# Altium footprint library sun_library.PcbLib: 412 footprints (part 1 of 26)
Each footprint in its own frame and in the unit in brackets; x right, y up, seen from the top. Pads: shape width x height; smd on the part's side, far side on the other; paste and mask are expansions set on the pad; w line width, h text height; cw(c..) or ccw(c..) is an arc to the next point about the centre after c.
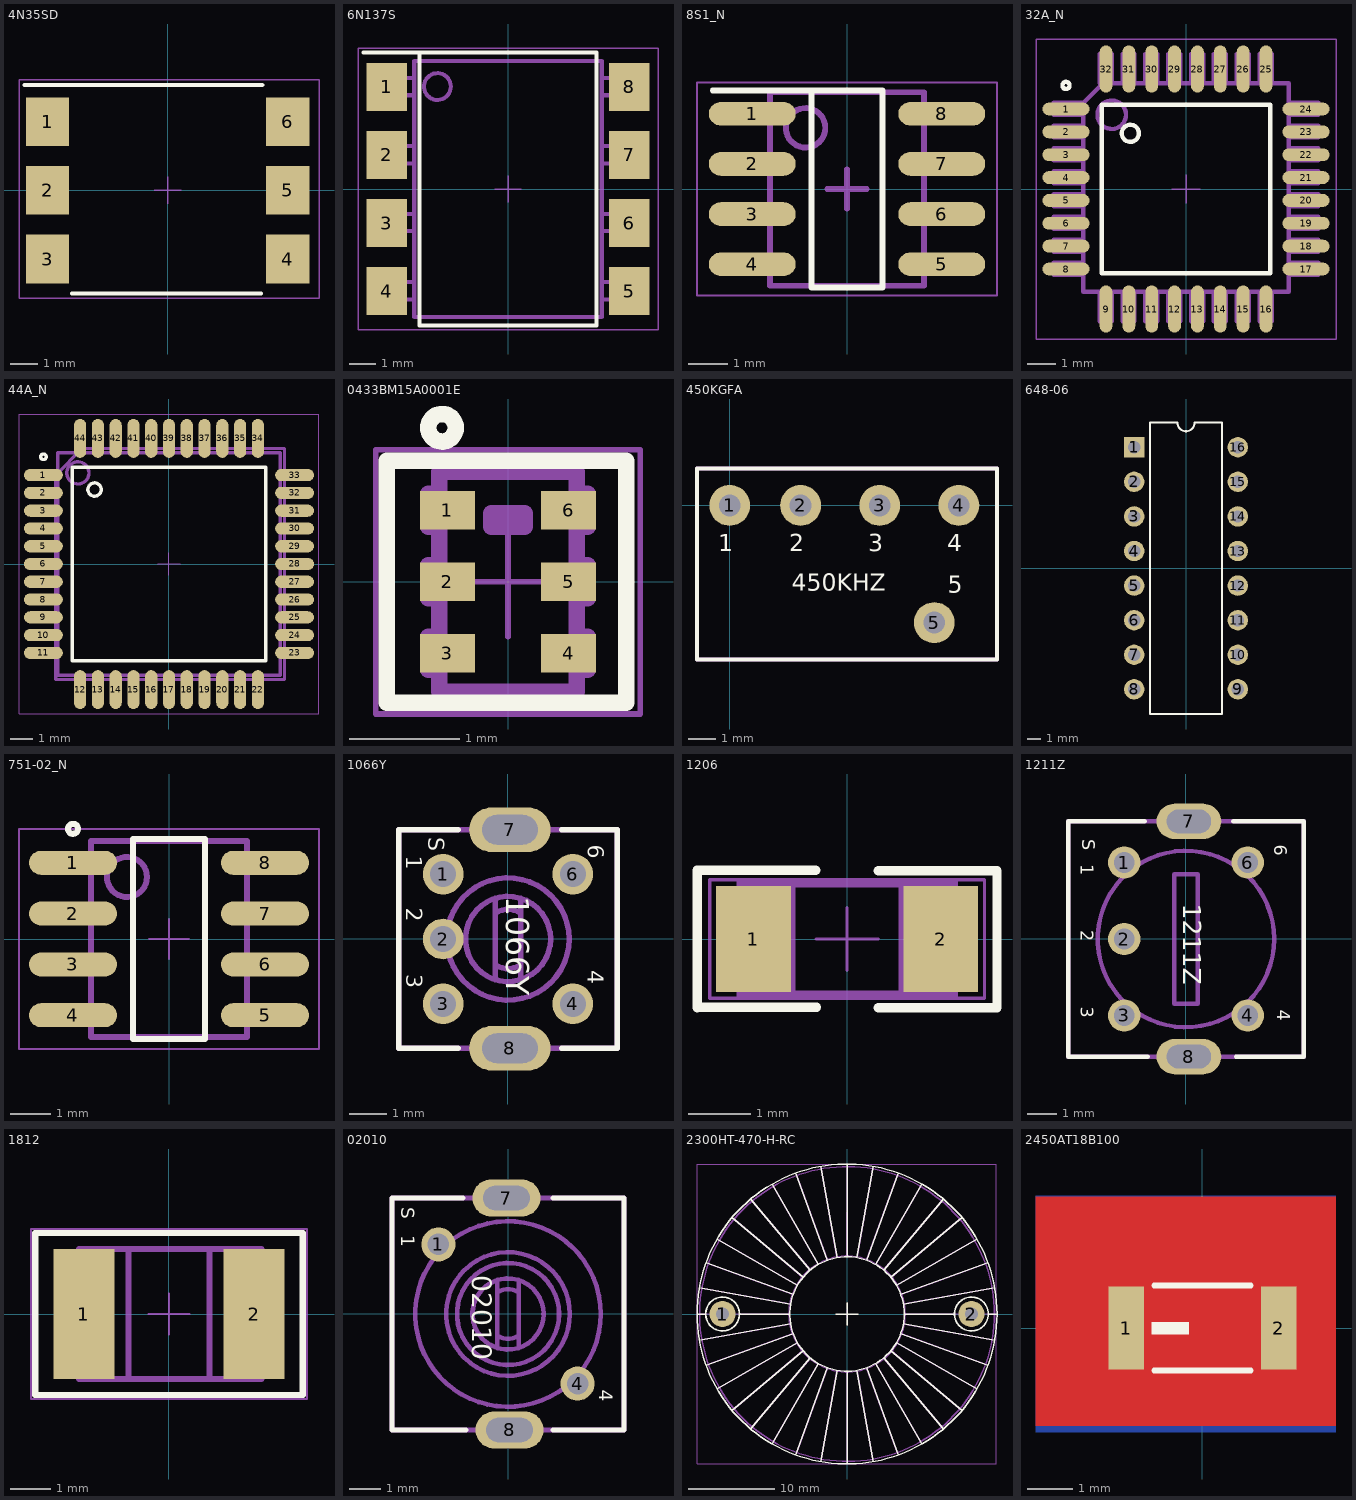
[diagram p0: the footprints below, top view; thin cyan lines are the x and y axes]

## 4N35SD [mm] "оптрон"
height 5
pads (6):
  rect 1.6x1.8 smd: 1(-4.445,2.54) 2(-4.445,0) 3(-4.445,-2.54) 4(4.445,-2.54) 5(4.445,0) 6(4.445,2.54)
Top Overlay:
  lines w0.15: -5.3,3.9 3.5,3.9 ; -3.545,-3.81 3.455,-3.81
CourtTop 15:
  lines w0.05: -0.5,0 0.5,0 ; 0,-0.5 0,0.5 ; -5.5,-4 -5.5,4.1 5.6,4.1 5.6,-4 -5.5,-4

## 6N137S [mm] "Оптрон 10Mbs"
height 1.8
pads (8):
  rect 1.52x1.78 smd: 1(-4.525,3.81) 2(-4.525,1.27) 3(-4.525,-1.27) 4(-4.525,-3.81) 5(4.525,-3.81) 6(4.525,-1.27) 7(4.525,1.27) 8(4.525,3.81)
Top Overlay:
  lines w0.15: -5.4,5.1 -3.3,5.1 ; -3.3,5.1 3.3,5.1 3.3,-5.1 -3.3,-5.1 -3.3,5.1
TopAssy 13:
  circle w0.15: c-2.635,3.825 r0.5
  lines w0.15: -3.5,-4.125 -5.15,-4.125 -5.15,-3.475 -3.5,-3.475 ; -3.5,-1.575 -5.15,-1.575 -5.15,-0.925 -3.5,-0.925 ; -3.5,0.95 -5.15,0.95 -5.15,1.6 -3.5,1.6 ; -3.5,3.5 -5.15,3.5 -5.15,4.15 -3.5,4.15 ; 3.5,-4.125 5.15,-4.125 5.15,-3.475 3.5,-3.475 ; 3.5,-1.575 5.15,-1.575 5.15,-0.925 3.5,-0.925 ; 3.5,0.95 5.15,0.95 5.15,1.6 3.5,1.6 ; 3.5,3.5 5.15,3.5 5.15,4.15 3.5,4.15 ; -3.5,-4.775 -3.5,4.775 3.5,4.775 3.5,-4.775 -3.5,-4.775
CourtTop 15:
  lines w0.05: -0.5,0 0.5,0 ; 0,-0.5 0,0.5 ; -5.6,-5.25 -5.6,5.25 5.6,5.25 5.6,-5.25 -5.6,-5.25
3D body "User Library-pdip8-smd.step": height 5.08, standoff 0, extent -5.15,-4.955 5.15,4.955

## 8S1_N [mm] "8-Pin Small Outline Integrated Circuit 1.27 mm Pitch, IPC Medium Density"
height 1.73
pads (8):
  oval 2.2x0.6 smd: 1(-2.4,1.905) 2(-2.4,0.635) 3(-2.4,-0.635) 4(-2.4,-1.905) 5(2.4,-1.905) 6(2.4,-0.635) 7(2.4,0.635) 8(2.4,1.905)
Top Overlay:
  lines w0.15: -3.4,2.5 -3.4,2.5 ; -3.4,2.5 -0.9,2.5 ; -0.9,2.5 0.9,2.5 0.9,-2.5 -0.9,-2.5 -0.9,2.5
TopAssy 13:
  circle w0.15: c-1.05,1.55 r0.5
  lines w0.15: -0.5,0 0.5,0 ; 0,-0.5 0,0.5 ; -1.95,-2.45 -1.95,2.45 1.95,2.45 1.95,-2.45 -1.95,-2.45
CourtTop 15:
  lines w0.05: -0.5,0 0.5,0 ; 0,-0.5 0,0.5 ; -3.8,-2.7 -3.8,2.7 3.8,2.7 3.8,-2.7 -3.8,-2.7
3D body "User Library-SOIC-8.STEP": height 1.75, standoff 0, extent -3.006,-2.5 3.006,2.5

## 32A_N [mm] "Thin QFP, 32-Leads, Body 7x7mm, Pitch 0.8mm, IPC Medium Density"
height 1.2
pads (32):
  oval 1.65x0.45 smd mask+0.075: 1(-4.2,2.8) 2(-4.2,2) 3(-4.2,1.2) 4(-4.2,0.4) 5(-4.2,-0.4) 6(-4.2,-1.2) 7(-4.2,-2) 8(-4.2,-2.8) 17(4.2,-2.8) 18(4.2,-2) 19(4.2,-1.2) 20(4.2,-0.4) 21(4.2,0.4) 22(4.2,1.2) 23(4.2,2) 24(4.2,2.8)
  oval 0.45x1.65 smd mask+0.075: 9(-2.8,-4.2) 10(-2,-4.2) 11(-1.2,-4.2) 12(-0.4,-4.2) 13(0.4,-4.2) 14(1.2,-4.2) 15(2,-4.2) 16(2.8,-4.2) 25(2.8,4.2) 26(2,4.2) 27(1.2,4.2) 28(0.4,4.2) 29(-0.4,4.2) 30(-1.2,4.2) 31(-2,4.2) 32(-2.8,4.2)
Top Overlay:
  circle w0.15: c-1.95,1.95 r0.3
  circle w0.15: c-4.2,3.625 r0.125
  lines w0.15: -2.95,-2.95 2.95,-2.95 2.95,2.95 -2.95,2.95 -2.95,-2.95
TopAssy 13:
  circle w0.15: c-2.6,2.6 r0.5
  lines w0.15: -3.6,-3 -4.625,-3 -4.625,-2.575 -3.6,-2.575 ; -3.6,-2.2 -4.625,-2.2 -4.625,-1.775 -3.6,-1.775 ; -3.6,-1.4 -4.625,-1.4 -4.625,-0.975 -3.6,-0.975 ; -3.6,-0.6 -4.625,-0.6 -4.625,-0.175 -3.6,-0.175 ; -3.6,0.2 -4.625,0.2 -4.625,0.625 -3.6,0.625 ; -3.6,1 -4.625,1 -4.625,1.425 -3.6,1.425 ; -3.6,1.8 -4.625,1.8 -4.625,2.225 -3.6,2.225 ; -3.025,3.7 -3.025,4.725 -2.6,4.725 -2.6,3.7 ; -2.225,-3.6 -2.225,-4.625 -1.8,-4.625 -1.8,-3.6 ; -2.225,3.7 -2.225,4.725 -1.8,4.725 -1.8,3.7 ; -1.425,-3.6 -1.425,-4.625 -1,-4.625 -1,-3.6 ; -1.425,3.7 -1.425,4.725 -1,4.725 -1,3.7 ; -0.625,-3.6 -0.625,-4.625 -0.2,-4.625 -0.2,-3.6 ; -0.625,3.7 -0.625,4.725 -0.2,4.725 -0.2,3.7 ; 0.175,-3.6 0.175,-4.625 0.6,-4.625 0.6,-3.6 ; 0.175,3.7 0.175,4.725 0.6,4.725 0.6,3.7 ; 0.975,-3.6 0.975,-4.625 1.4,-4.625 1.4,-3.6 ; 0.975,3.7 0.975,4.725 1.4,4.725 1.4,3.7 ; 1.775,-3.6 1.775,-4.625 2.2,-4.625 2.2,-3.6 ; 1.775,3.7 1.775,4.725 2.2,4.725 2.2,3.7 ; 2.575,-3.6 2.575,-4.625 3,-4.625 3,-3.6 ; 3.6,-2.2 4.625,-2.2 4.625,-1.775 3.6,-1.775 ; 3.6,-1.4 4.625,-1.4 4.625,-0.975 3.6,-0.975 ; 3.6,-0.6 4.625,-0.6 4.625,-0.175 3.6,-0.175 ; 3.6,0.2 4.625,0.2 4.625,0.625 3.6,0.625 ; 3.6,1 4.625,1 4.625,1.425 3.6,1.425 ; 3.6,1.8 4.625,1.8 4.625,2.225 3.6,2.225 ; 3.6,2.6 4.625,2.6 4.625,3.025 3.6,3.025 ; -4.625,2.6 -4.625,3.025 ; -4.625,2.6 -3.6,2.6 -4.625,2.6 ; -4.625,2.6 -4.625,3.025 ; -4.625,3.025 -3.6,3.025 -4.625,3.025 ; -3.025,-4.625 -2.6,-4.625 ; -3.025,-4.625 -3.025,-3.6 -3.025,-4.625 ; -3.025,-4.625 -2.6,-4.625 ; -2.6,-4.625 -2.6,-3.6 -2.6,-4.625 ; 2.575,4.725 3,4.725 ; 2.575,4.725 2.575,3.7 2.575,4.725 ; 2.575,4.725 3,4.725 ; 3,4.725 3,3.7 3,4.725 ; 4.625,-3 4.625,-2.575 ; 4.625,-3 3.6,-3 4.625,-3 ; 4.625,-3 4.625,-2.575 ; 4.625,-2.575 3.6,-2.575 4.625,-2.575 ; -3.6,-3.6 -3.6,3 -2.9,3.7 3.6,3.7 3.6,-3.6 -3.6,-3.6
CourtTop 15:
  lines w0.05: -0.5,0 0.5,0 ; 0,-0.5 0,0.5 ; -5.25,-5.25 5.25,-5.25 5.25,5.25 -5.25,5.25 -5.25,-5.25
3D body "User Library-TQFP-32.STEP": height 1.45, standoff -0.01, extent -4.5,-4.5 4.5,4.5

## 44A_N [mm] "Thin QFP, 44-Leads, Body 10x10mm, Pitch 0.8mm, IPC Medium Density"
height 1.2
pads (44):
  oval 1.75x0.55 smd: 1(-5.65,4) 2(-5.65,3.2) 3(-5.65,2.4) 4(-5.65,1.6) 5(-5.65,0.8) 6(-5.65,0) 7(-5.65,-0.8) 8(-5.65,-1.6) 9(-5.65,-2.4) 10(-5.65,-3.2) 11(-5.65,-4) 23(5.65,-4) 24(5.65,-3.2) 25(5.65,-2.4) 26(5.65,-1.6) 27(5.65,-0.8) 28(5.65,0) 29(5.65,0.8) 30(5.65,1.6) 31(5.65,2.4) 32(5.65,3.2) 33(5.65,4)
  oval 0.55x1.75 smd: 12(-4,-5.65) 13(-3.2,-5.65) 14(-2.4,-5.65) 15(-1.6,-5.65) 16(-0.8,-5.65) 17(0,-5.65) 18(0.8,-5.65) 19(1.6,-5.65) 20(2.4,-5.65) 21(3.2,-5.65) 22(4,-5.65) 34(4,5.65) 35(3.2,5.65) 36(2.4,5.65) 37(1.6,5.65) 38(0.8,5.65) 39(0,5.65) 40(-0.8,5.65) 41(-1.6,5.65) 42(-2.4,5.65) 43(-3.2,5.65) 44(-4,5.65)
Top Overlay:
  circle w0.15: c-5.65,4.825 r0.125
  circle w0.15: c-3.35,3.35 r0.3
  lines w0.15: -4.35,-4.35 -4.35,4.35 4.35,4.35 4.35,-4.35 -4.35,-4.35
TopAssy 13:
  circle w0.15: c-4.1,4.1 r0.5
  lines w0.15: -5.1,-5.2 5.2,-5.2 5.2,5.2 -3.9,5.2 -5.1,4 -5.1,-5.2 ; -5,-5 -5,5 5,5 5,-5 -5,-5
CourtTop 15:
  lines w0.05: -0.5,0 0.5,0 ; 0,-0.5 0,0.5 ; -6.75,-6.75 -6.75,6.75 6.75,6.75 6.75,-6.75 -6.75,-6.75
3D body "User Library-TQFP-44.STEP": height 1, standoff -0.06, extent -6,-6 6,6

## 0433BM15A0001E [mm]
pads (6):
  rect 0.5x0.35 smd mask+0.075: 1(-0.55,0.65) 2(-0.55,0) 3(-0.55,-0.65) 4(0.55,-0.65) 5(0.55,0) 6(0.55,0.65)
Top Overlay:
  circle w0.15: c-0.6,1.4 r0.125
  lines w0.15: -1.1,-1.1 1.075,-1.1 1.075,1.1 -1.1,1.1 -1.1,-1.1
TopAssy 13:
  lines w0.15: -0.625,-0.8 -0.725,-0.8 -0.725,-0.5 -0.625,-0.5 ; -0.625,-0.15 -0.725,-0.15 -0.725,0.15 -0.625,0.15 ; -0.625,0.5 -0.725,0.5 -0.725,0.8 -0.625,0.8 ; 0.625,-0.8 0.725,-0.8 0.725,-0.5 0.625,-0.5 ; 0.625,-0.15 0.725,-0.15 0.725,0.15 0.625,0.15 ; 0.625,0.5 0.725,0.5 0.725,0.8 0.625,0.8 ; -0.625,-1 0.625,-1 0.625,1 -0.625,1 -0.625,-1 ; -0.15,0.5 -0.15,0.625 0.15,0.625 0.15,0.5 -0.15,0.5
CourtTop 15:
  lines w0.05: -0.5,0 0.5,0 ; 0,-0.5 0,0.5 ; -1.2,-1.2 1.2,-1.2 1.2,1.2 -1.2,1.2 -1.2,-1.2
3D body "User Library-0433BM15A0001E.step": height 0.69, standoff -0.02, extent -0.635,-1 0.635,1

## 450KGFA [mm]
pads (5):
  round 1.5 hole 0.8: 1(0,0) 2(2.6,0) 3(5.5,0) 4(8.4,0) 5(7.5,-4.3)
Top Overlay:
  lines w0.15: -1.2,-5.65 -1.2,1.35 9.8,1.35 9.8,-5.65 -1.2,-5.65
  text "1" at -0.425,-1.675 h0.63
  text "2" at 2.175,-1.675 h0.63
  text "3" at 5.075,-1.675 h0.63
  text "4" at 7.975,-1.675 h0.63
  text "5" at 8,-3.2 h0.63
  text "450KHZ" at 2.266,-3.125 h0.63
TopAssy 13:
  lines w0.15: -1.2,-5.65 -1.2,1.35 9.8,1.35 9.8,-5.65 -1.2,-5.65

## 648-06 [mm] "DIP; 16 Leads; Row Spacing 7.62 mm; Pitch 2.54 mm"
height 4.69
pads (16):
  rect 1.5x1.5 hole 0.9: 1(-3.81,8.89)
  round 1.5 hole 0.9: 2(-3.81,6.35) 3(-3.81,3.81) 4(-3.81,1.27) 5(-3.81,-1.27) 6(-3.81,-3.81) 7(-3.81,-6.35) 8(-3.81,-8.89) 9(3.81,-8.89) 10(3.81,-6.35) 11(3.81,-3.81) 12(3.81,-1.27) 13(3.81,1.27) 14(3.81,3.81) 15(3.81,6.35) 16(3.81,8.89)
Top Overlay:
  lines w0.15: -2.65,-10.7 2.65,-10.7 2.65,10.7 0.635,10.7 cw(c0,10.7) -0.635,10.7 -2.65,10.7 -2.65,-10.7

## 751-02_N [mm] "SOIC, 8-Leads, Body 4.9x3.9mm, Pitch 1.27mm, IPC Medium Density"
height 1.75
pads (8):
  oval 2.2x0.6 smd: 1(-2.4,1.905) 2(-2.4,0.635) 3(-2.4,-0.635) 4(-2.4,-1.905) 5(2.4,-1.905) 6(2.4,-0.635) 7(2.4,0.635) 8(2.4,1.905)
Top Overlay:
  circle w0.15: c-2.4,2.755 r0.125
  lines w0.15: -0.9,-2.5 -0.9,2.5 0.9,2.5 0.9,-2.5 -0.9,-2.5
TopAssy 13:
  circle w0.15: c-1.05,1.55 r0.5
  lines w0.15: -1.95,-2.45 -1.95,2.45 1.95,2.45 1.95,-2.45 -1.95,-2.45
CourtTop 15:
  lines w0.05: -0.5,0 0.5,0 ; 0,-0.5 0,0.5 ; -3.75,-2.75 -3.75,2.75 3.75,2.75 3.75,-2.75 -3.75,-2.75
3D body: height 1.75, standoff 0, extent -1.95,-2.45 1.95,2.45

## 1066Y [mm]
pads (7):
  round 1.1 hole 0.7: 1(-1.75,1.75) 2(-1.75,0) 3(-1.75,-1.75) 4(1.75,-1.75) 6(1.75,1.75)
  oval 2.2x1.2 hole 0.8 slot 1.5 at 0 deg: 7(0.05,2.95) 8(0.05,-2.95)
Top Overlay:
  lines w0.15: -1.35,-2.95 -2.95,-2.95 -2.95,2.95 -1.35,2.95 ; 1.45,-2.95 2.95,-2.95 2.95,2.95 1.45,2.95
  text "1" at -2.75,2.25 h0.44
  text "2" at -2.75,0.85 h0.44
  text "3" at -2.75,-0.95 h0.44
  text "4" at 2.15,-0.85 h0.44
  text "S" at -2.15,2.75 h0.44
  text "1066Y" at -0.05,1.15 h0.63
  text "6" at 2.15,2.55 h0.44
TopAssy 13:
  circle w0.15: c0,0 r1.15
  circle w0.15: c0,0 r1.65
  lines w0.15: -0.35,-1.1 -0.35,1.1 ; -0.35,0.7 cw(c0,0.137) 0.35,0.7 ; -0.349,-0.701 ccw(c0,-0.138) 0.349,-0.701 ; 0.35,-1.1 0.35,1.1 ; -2.95,-2.95 2.95,-2.95 2.95,2.95 -2.95,2.95 -2.95,-2.95

## 1206 [mm]
pads (2):
  rect 1.2x1.7 smd: 1(-1.5,0) 2(1.5,0)
Top Overlay:
  lines w0.15: -2.405,1.1 -0.5,1.1 ; -2.4,-1.1 -2.4,1.1 ; -2.395,-1.095 -0.49,-1.095 ; 0.5,-1.1 2.4,-1.1 2.401,1.095 0.501,1.095
TopAssy 13:
  rectangle: -1.7,-0.9 -0.825,0.9
  rectangle: 0.825,-0.9 1.7,0.9
  lines w0.15: -1.7,-0.9 -1.7,0.9 1.7,0.9 1.7,-0.9 -1.7,-0.9
CourtTop 15:
  lines w0.05: -0.5,0 0.5,0 ; 0,-0.5 0,0.5 ; -2.2,-0.95 2.2,-0.95 2.2,0.95 -2.2,0.95 -2.2,-0.95

## 1211Z [mm]
pads (7):
  round 1.1 hole 0.7: 1(-2.1,2.6) 2(-2.1,0) 3(-2.1,-2.6) 4(2.1,-2.6) 6(2.1,2.6)
  oval 2.2x1.2 hole 0.8 slot 1.5 at 0 deg: 7(0.1,4) 8(0.1,-4)
Top Overlay:
  lines w0.15: -1.4,4 -4,4 -4,-4 -1.3,-4 ; 1.6,4 4,4 4,-4 1.7,-4
  text "6" at 3,3.2 h0.44
  text "3" at -3.572,-2.303 h0.44
  text "2" at -3.572,0.297 h0.44
  text "1211Z" at -0.1,1.2 h0.63
  text "S" at -3.522,3.397 h0.44
  text "4" at 3.1,-2.4 h0.44
  text "1" at -3.572,2.547 h0.44
TopAssy 13:
  circle w0.15: c0,0 r3
  lines w0.15: -4,-4 -4,4 4,4 4,-4 -4,-4 ; -0.4,-2.2 -0.4,2.2 0.4,2.2 0.4,-2.2 -0.4,-2.2

## 1812 [mm]
pads (2):
  rect 1.5x3.2 smd: 1(-2.1,0) 2(2.1,0)
Top Overlay:
  lines w0.15: -3.3,-2 3.3,-2 3.3,2 -3.3,2 -3.3,-2
TopAssy 13:
  lines w0.15: -1,-1.6 -1,1.6 ; 1,-1.6 1,1.6 ; -2.225,-1.6 -2.225,-0.8 -1.9,-0.475 -1.9,0.475 -2.225,0.8 -2.225,1.6 2.275,1.6 2.275,0.8 2,0.525 2,-0.525 2.275,-0.8 2.275,-1.6 -2.225,-1.6
CourtTop 15:
  lines w0.05: -0.5,0 0.5,0 ; 0,-0.5 0,0.5 ; -3.4,-2.1 -3.4,2.1 3.4,2.1 3.4,-2.1 -3.4,-2.1
3D body "User Library-MF-MSMF075.step": height 0.71, standoff 0, extent -2.257,-1.636 2.293,1.604

## 02010 [mm]
pads (4):
  round 1.1 hole 0.7: 1(-2.25,2.25) 4(2.25,-2.25)
  oval 2.2x1.2 hole 0.8 slot 1.5 at 0 deg: 7(-0.05,3.75) 8(0.05,-3.75)
Top Overlay:
  lines w0.15: -1.45,3.75 -3.75,3.75 -3.75,-3.75 -1.35,-3.75 ; 1.45,-3.75 3.75,-3.75 3.75,3.75 1.45,3.75
  text "1" at -3.45,2.55 h0.44
  text "4" at 2.95,-2.45 h0.44
  text "S" at -3.45,3.45 h0.44
  text "02010" at -1.15,1.25 h0.63
TopAssy 13:
  circle w0.15: c0,0 r1.15
  circle w0.15: c0,0 r1.65
  circle w0.15: c0,0 r2
  circle w0.15: c0,0 r3
  lines w0.15: -0.35,-1.1 -0.35,1.1 ; -0.35,0.7 cw(c0,0.137) 0.35,0.7 ; -0.349,-0.701 ccw(c0,-0.138) 0.349,-0.701 ; 0.35,-1.1 0.35,1.1 ; -3.75,-3.75 -3.75,3.75 3.75,3.75 3.75,-3.75 -3.75,-3.75

## 2300HT-470-H-RC [mm] "High Current Toroid Inductors"
height 16
pads (2):
  round 3 hole 1.5: 1(-14.35,0) 2(14.35,0)
Top Overlay:
  circle w0.2: c-14.35,0 r1.953
  circle w0.2: c14.35,0 r1.953
  circle w0.15: c0,0 r17.3
  circle w0.15: c0,0 r6.6
  lines w0.15: -17.3,0 -16.3,0 ; -17.037,-3.004 -6.5,-1.146 ; -17.037,3.004 -6.5,1.146 ; -16.257,-5.917 -6.202,-2.257 ; -16.257,5.917 -6.202,2.257 ; -14.982,-8.65 -5.716,-3.3 ; -14.982,8.65 -5.716,3.3 ; -13.253,-11.12 -5.056,-4.242 ; -13.253,11.12 -5.056,4.242 ; -12.4,0 -6.6,0 ; -11.12,-13.253 -4.242,-5.056 ; -11.12,13.253 -4.242,5.056 ; -8.65,-14.982 -3.3,-5.716 ; -8.65,14.982 -3.3,5.716 ; -5.917,-16.257 -2.257,-6.202 ; -5.917,16.257 -2.257,6.202 ; -3.004,-17.037 -1.146,-6.5 ; -3.004,17.037 -1.146,6.5 ; -1.3,0 1.27,0 ; 0,-1.3 0,1.3 ; 0,6.6 0,17.3 ; 1.146,-6.5 3.004,-17.037 ; 1.146,6.5 3.004,17.037 ; 2.257,-6.202 5.917,-16.257 ; 2.257,6.202 5.917,16.257 ; 3.3,-5.716 8.65,-14.982 ; 3.3,5.716 8.65,14.982 ; 4.242,-5.056 11.12,-13.253 ; 4.242,5.056 11.12,13.253 ; 5.056,-4.242 13.253,-11.12 ; 5.056,4.242 13.253,11.12 ; 5.716,-3.3 14.982,-8.65 ; 5.716,3.3 14.982,8.65 ; 6.202,-2.257 16.257,-5.917 ; 6.202,2.257 16.257,5.917 ; 6.5,-1.146 17.037,-3.004 ; 6.5,1.146 17.037,3.004 ; 6.6,0 12.3,0 ; 16.3,0 17.3,0 ; 0,-17.3 0,-6.6 0,-17.3
TopAssy 13:
  circle w0.2: c14.35,0 r0.702
  circle w0.2: c-14.35,0 r0.702
  circle w0.15: c0,0 r17
  circle w0.15: c0,0 r6.7
  lines w0.15: -17,0 -6.7,0 ; -16.742,-2.952 -6.598,-1.163 ; -16.742,2.952 -6.598,1.163 ; -15.975,-5.814 -6.296,-2.292 ; -15.975,5.814 -6.296,2.292 ; -14.722,-8.5 -5.802,-3.35 ; -14.722,8.5 -5.802,3.35 ; -13.023,-10.927 -5.132,-4.307 ; -13.023,10.927 -5.133,4.307 ; -10.927,-13.023 -4.307,-5.133 ; -10.927,13.023 -4.307,5.132 ; -8.5,-14.722 -3.35,-5.802 ; -8.5,14.722 -3.35,5.802 ; -5.814,-15.975 -2.292,-6.296 ; -5.814,15.975 -2.292,6.296 ; -2.952,-16.742 -1.163,-6.598 ; -2.952,16.742 -1.163,6.598 ; 0,6.7 0,17 ; 1.163,-6.598 2.952,-16.742 ; 1.163,6.598 2.952,16.742 ; 2.292,-6.296 5.814,-15.975 ; 2.292,6.296 5.814,15.975 ; 3.35,-5.802 8.5,-14.722 ; 3.35,5.802 8.5,14.722 ; 4.307,-5.132 10.927,-13.023 ; 4.307,5.133 10.927,13.023 ; 5.133,-4.307 13.023,-10.927 ; 5.132,4.307 13.023,10.927 ; 5.802,-3.35 14.722,-8.5 ; 5.802,3.35 14.722,8.5 ; 6.296,-2.292 15.975,-5.814 ; 6.296,2.292 15.975,5.814 ; 6.598,-1.163 16.742,-2.952 ; 6.598,1.163 16.742,2.952 ; 6.7,0 17,0 ; 0,-17 0,-6.7 0,-17
  text ".Designator" at -4.9,2.4 h2.69
CourtTop 15:
  lines w0.05: -0.5,0 0.5,0 ; 0,-0.5 0,0.5 ; -17.3,-17.3 -17.3,17.3 17.2,17.3 17.2,-17.3 -17.3,-17.3
3D body "2300HT-470-H-RC.stp": height 17.52, standoff -12.1, extent -17.058,-17.088 17.037,17.087

## 2450AT18B100 [mm] "2450MHz Antenna"
height 1.4
pads (2):
  rect 0.8x1.85 smd: 1(-1.7,0) 2(1.7,0)
Top:
  pour cut-out: -3.71,-2.175 -3.71,2.925 2.975,2.925 2.975,-2.175
Bottom:
  pour cut-out: -3.71,-2.325 -3.71,2.95 2.975,2.95 2.975,-2.325
Top Overlay:
  region: -0.3,-0.14 -0.3,0.13 -1.14,0.13 -1.14,-0.14
  lines w0.13: -1.075,-0.95 1.075,-0.95 ; -1.075,0.95 1.075,0.95
TopAssy 13:
  lines w0.1: -1.129,-0.77 1.129,-0.77 ; -1.129,0.77 1.129,0.77 ; -1.6,-0.7 ccw(c-1.5,-0.7) -1.5,-0.8 -1.2,-0.8 ccw(c-1.2,-0.7) -1.1,-0.7 -1.1,0.7 ccw(c-1.2,0.7) -1.2,0.8 -1.5,0.8 ccw(c-1.5,0.7) -1.6,0.7 -1.6,-0.7 ; 1.1,-0.7 ccw(c1.2,-0.7) 1.2,-0.8 1.5,-0.8 ccw(c1.5,-0.7) 1.6,-0.7 1.6,0.7 ccw(c1.5,0.7) 1.5,0.8 1.2,0.8 ccw(c1.2,0.7) 1.1,0.7 1.1,-0.7
CourtTop 15:
  lines w0.1: -0.5,0 0.5,0 ; 0,-0.5 0,0.5 ; -2.35,-1.175 -2.35,1.175 2.35,1.175 2.35,-1.175 -2.35,-1.175
3D body: height 1.4, standoff 0, extent -1.7,-0.9 1.7,0.9